# Altium footprint library PCBLIB.PcbLib: 557 footprints (part 28 of 36)
Each footprint in its own frame and in the unit in brackets; x right, y up, seen from the top. Pads: shape width x height; smd on the part's side, far side on the other; paste and mask are expansions set on the pad; w line width, h text height; cw(c..) or ccw(c..) is an arc to the next point about the centre after c.
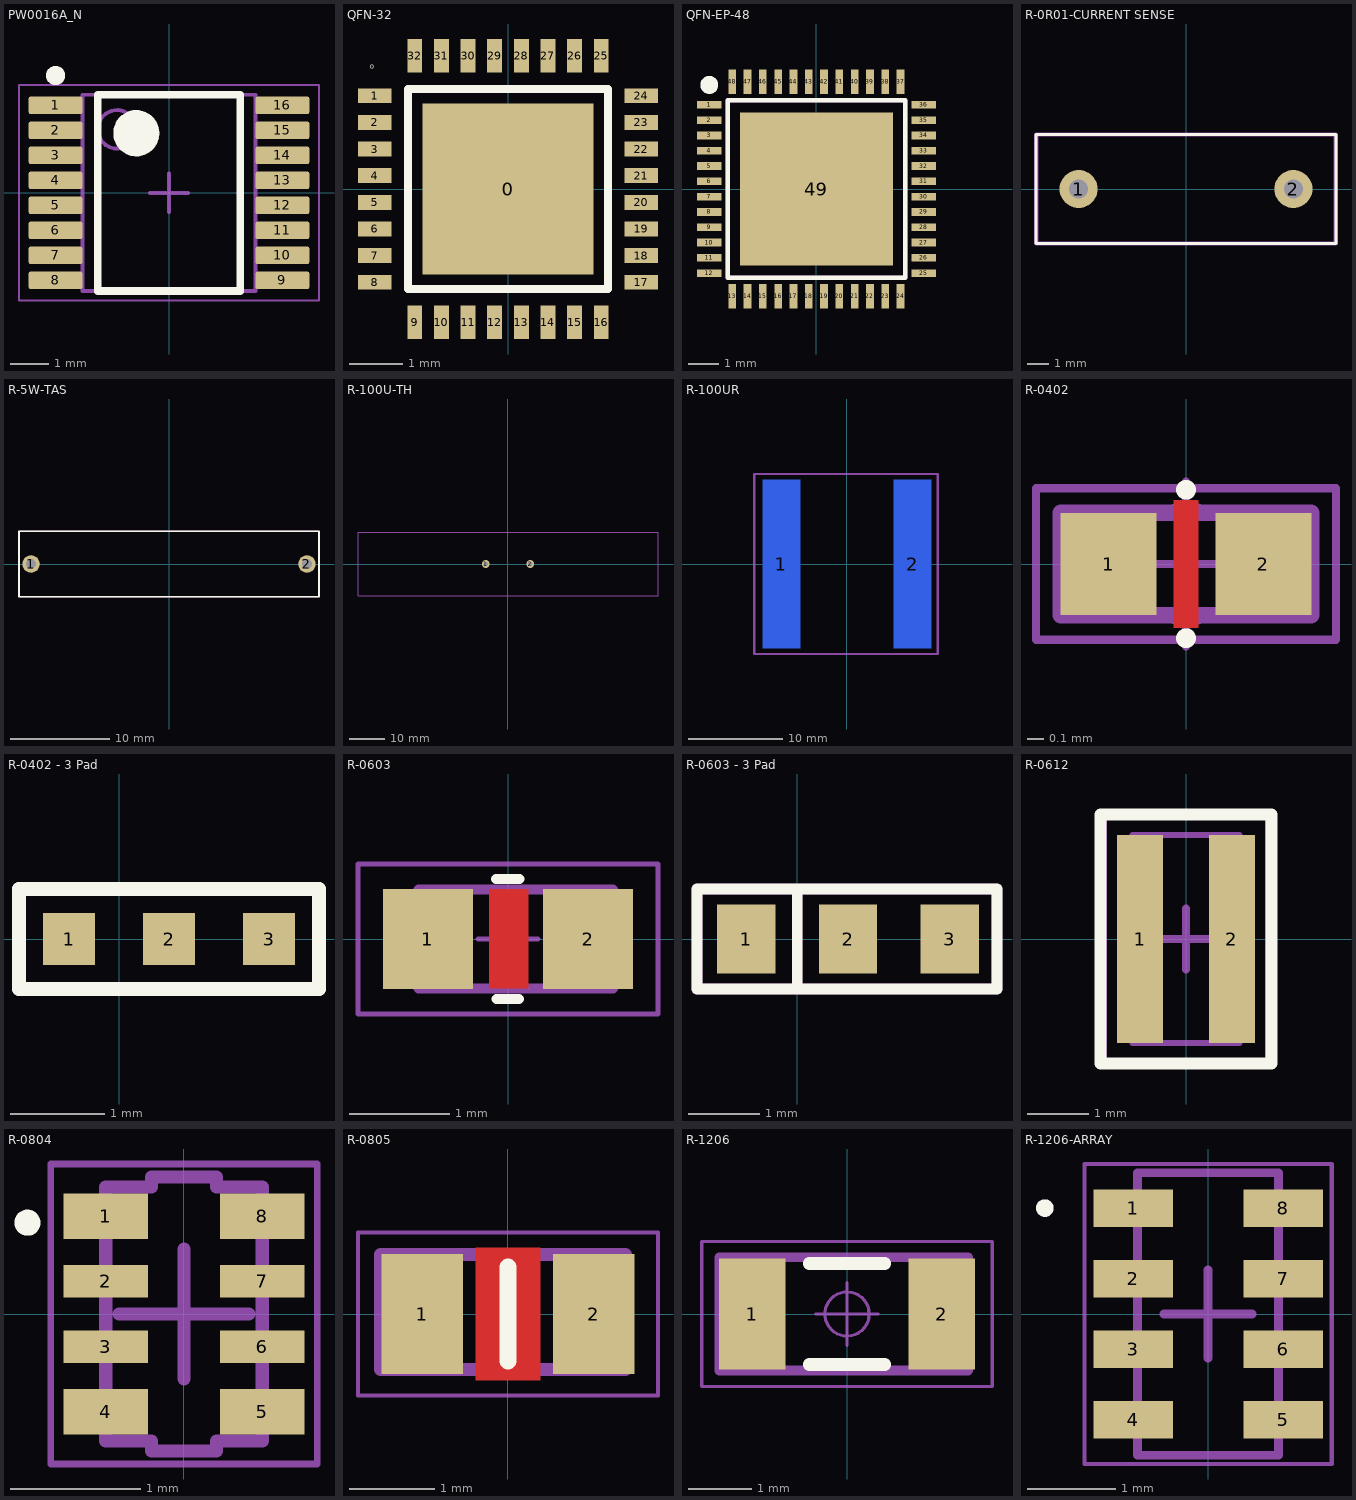
[diagram p27: the footprints below, top view; thin cyan lines are the x and y axes]

## PW0016A_N [mm] "SOP, 16-Leads, Body 5.1x4.5mm, Pitch 0.65mm, IPC Medium Density"
height 1.2
pads (16):
  rrect22% 1.4x0.45 smd: 1(-2.95,2.275) 2(-2.95,1.625) 3(-2.95,0.975) 4(-2.95,0.325) 5(-2.95,-0.325) 6(-2.95,-0.975) 7(-2.95,-1.625) 8(-2.95,-2.275) 9(2.95,-2.275) 10(2.95,-1.625) 11(2.95,-0.975) 12(2.95,-0.325) 13(2.95,0.325) 14(2.95,0.975) 15(2.95,1.625) 16(2.95,2.275)
Top Overlay:
  circle w0.25: c-2.95,3.05 r0.125
  circle w0.6: c-0.85,1.55 r0.3
  lines w0.2: -1.85,-2.55 -1.85,2.55 1.85,2.55 1.85,-2.55 -1.85,-2.55
Top 3D Body:
  text ".Designator" at -1.524,-0.508 h1.02
Mechanical 13:
  circle w0.1: c-1.35,1.65 r0.5
  lines w0.1: -2.25,-2.55 -2.25,2.55 2.25,2.55 2.25,-2.55 -2.25,-2.55
Mechanical 15:
  lines w0.05: -3.9,-2.8 -3.9,2.8 3.9,2.8 3.9,-2.8 -3.9,-2.8
  lines w0.1: -0.5,0 0.5,0 ; 0,-0.5 0,0.5
3D body "PW0016AakaMTC16.stp": height 1, standoff 0, extent -3.21,-2.5 3.21,2.5

## QFN-32 [mm]
pads (33):
  rect 3.2x3.2 smd paste-100 mask+0: 0(0,0)
  rect 0.63x0.28 smd mask+0.051: 1(-2.5,1.75) 2(-2.5,1.25) 3(-2.5,0.75) 4(-2.5,0.25) 5(-2.5,-0.25) 6(-2.5,-0.75) 7(-2.5,-1.25) 8(-2.5,-1.75) 17(2.5,-1.75) 18(2.5,-1.25) 19(2.5,-0.75) 20(2.5,-0.25) 21(2.5,0.25) 22(2.5,0.75) 23(2.5,1.25) 24(2.5,1.75)
  rect 0.28x0.63 smd mask+0.051: 9(-1.75,-2.5) 10(-1.25,-2.5) 11(-0.75,-2.5) 12(-0.25,-2.5) 13(0.25,-2.5) 14(0.75,-2.5) 15(1.25,-2.5) 16(1.75,-2.5) 25(1.75,2.5) 26(1.25,2.5) 27(0.75,2.5) 28(0.25,2.5) 29(-0.25,2.5) 30(-0.75,2.5) 31(-1.25,2.5) 32(-1.75,2.5)
Top Overlay:
  lines w0.152: -1.88,-1.88 -1.88,1.88 1.88,1.88 1.88,-1.88 -1.88,-1.88
  text "o" at -2.591,2.261 h0.1
3D body "QFN32-1.STEP": height 0.94, standoff 0.01, extent -2.515,-2.489 2.486,2.511

## QFN-EP-48 [mm]
pads (49):
  rect 0.8x0.25 smd mask+0.051: 1(-3.5,2.75) 2(-3.5,2.25) 3(-3.5,1.75) 4(-3.5,1.25) 5(-3.5,0.75) 6(-3.5,0.25) 7(-3.5,-0.25) 8(-3.5,-0.75) 9(-3.5,-1.25) 10(-3.5,-1.75) 11(-3.5,-2.25) 12(-3.5,-2.75) 25(3.5,-2.75) 26(3.5,-2.25) 27(3.5,-1.75) 28(3.5,-1.25) 29(3.5,-0.75) 30(3.5,-0.25) 31(3.5,0.25) 32(3.5,0.75) 33(3.5,1.25) 34(3.5,1.75) 35(3.5,2.25) 36(3.5,2.75)
  rect 0.25x0.8 smd mask+0.051: 13(-2.75,-3.5) 14(-2.25,-3.5) 15(-1.75,-3.5) 16(-1.25,-3.5) 17(-0.75,-3.5) 18(-0.25,-3.5) 19(0.25,-3.5) 20(0.75,-3.5) 21(1.25,-3.5) 22(1.75,-3.5) 23(2.25,-3.5) 24(2.75,-3.5) 37(2.75,3.5) 38(2.25,3.5) 39(1.75,3.5) 40(1.25,3.5) 41(0.75,3.5) 42(0.25,3.5) 43(-0.25,3.5) 44(-0.75,3.5) 45(-1.25,3.5) 46(-1.75,3.5) 47(-2.25,3.5) 48(-2.75,3.5)
  rect 5x5 smd paste-5.08: 49(0,0)
Top Overlay:
  circle w0.305: c-3.5,3.4 r0.141
  lines w0.152: -2.9,-2.9 2.9,-2.9 2.9,2.9 -2.9,2.9 -2.9,-2.9
Top Paste:
  region: 5.9,-0.2
  region: -0.568,2.349 0.579,2.349 0.579,1.213 -0.568,1.213
  region: -2.337,2.349 -1.2,2.349 -1.2,1.2 -2.337,1.2
  region: 1.2,2.349 2.324,2.349 2.324,1.213 1.2,1.213
  region: 1.2,0.541 2.324,0.541 2.324,-0.568 1.2,-0.568
  region: -0.575,0.567 0.548,0.567 0.548,-0.568 -0.575,-0.568
  region: -2.35,0.535 -1.2,0.535 -1.2,-0.575 -2.349,-0.575
  region: -2.35,-1.2 -1.2,-1.2 -1.2,-2.35 -2.349,-2.349
  region: -0.561,-1.213 0.561,-1.213 0.561,-2.35 -0.561,-2.349
  region: 1.2,-1.225 2.324,-1.225 2.324,-2.349 1.2,-2.35
ASM Top:
  lines w0.152: -2.9,-2.9 2.9,-2.9 2.9,2.9 -2.9,2.9 -2.9,-2.9
  text ".designator" at -1.905,-0.762 h0.8
3D body "QFN_48.STEP": height 1.11, standoff 0.01, extent -3.495,-3.505 3.505,3.495

## R-0R01-CURRENT SENSE [mil]
pads (2):
  round 70 hole 35: 1(-196.85,0) 2(196.85,0)
Top Overlay:
  lines w6: -275,-100 -275,100 275,100 275,-100 -275,-100
ASM Top:
  lines w7.87: -274.37,-99.47 -273.84,-100 274.47,-100 274.47,100 -274.37,100 -274.37,-99.47
  text ".designator" at -32,-7 h31.5
3D body "RADIAL-CURRENTSENSE.STEP": height 989.29, standoff -132.76, extent -275.59,-100 275.59,96.85

## R-5W-TAS [mil]
pads (2):
  round 70 hole 40: 1(-550,0) 2(550,0)
Top Overlay:
  lines w6: -598,-131 -598,131 598,131 598,-131 -598,-131
ASM Top:
  lines w6: -598,-131 598,-131 598,131 -598,131 -598,-131
  text ".designator" at -287,-22 h31.5
3D body "RES-5W.STEP": height 354.72, standoff -118.11, extent -567,-119.11 564.49,117.11

## R-100U-TH [mm]
pads (2):
  round 2.2 hole 1.4: 1(-6.26,0) 2(6.34,0)
ASM Top:
  lines w0.2: 42.534,8.993 -42.454,8.993 -42.454,-8.99 -42.454,-8.99 42.534,-8.99 42.534,8.993 ; 42.534,8.993 42.534,8.993
  text ".designator" at 0,0 h0.8
3D body "WSBS8518-20-60_100u.STEP": height 4.81, standoff -6.19, extent -42.454,-8.99 42.534,8.993

## R-100UR [mm]
pads (2):
  rect 4x18 smd far side: 1(-7,0) 2(7,0)
Bottom Overlay:
  lines w0.254: -9.903,-9.6 -9.903,9.6 9.697,9.6 9.697,-9.6 -9.903,-9.6
ASM Top:
  lines w0.254: -9.9,-9.6 -9.9,9.6 9.7,9.6 9.7,-9.6 -9.9,-9.6
  text ".designator" at -1.092,-0.203 h0.8
3D body "100uR sont.STEP": height -1.6, standoff -4.6, extent -42.545,-9.068 42.443,8.915

## R-0402 [mm]
pads (2):
  rect 0.58x0.62 smd: 1(-0.47,0) 2(0.47,0)
Top Layer:
  pour cut-out: -0.075,0.388 -0.075,-0.387 0.075,-0.387 0.075,0.388
Top Overlay:
  circle w0.1: c0,-0.45 r0.01
  circle w0.1: c0,0.45 r0.01
Mechanical 15:
  circle w0.05: c0,0 r0.35
  lines w0.05: -0.5,0 0.5,0 ; 0,-0.5 0,0.5 ; -0.91,-0.46 0.91,-0.46 0.91,0.46 -0.91,0.46 -0.91,-0.46
ASM Top:
  lines w0.1: -0.76,-0.31 0.76,-0.31 0.76,0.31 -0.76,0.31 -0.76,-0.31
  text ".designator" at -0.011,-0.078 h0.8
3D body "R_0402-son.STEP": height 0.36, standoff 0.01, extent -0.5,-0.25 0.5,0.25

## R-0402 - 3 Pad [mil]
pads (3):
  rect 22x22 smd: 1(-21,0) 2(21,0) 3(63,0)
Top Overlay:
  lines w6: -42,-21 84,-21 84,21 -42,21 -42,-21
ASM Top:
  lines w6: -42,-21 -42,21 84,21 84,-21 -42,-21
  text ".designator" at -28,-7 h31.5
3D body "R_0402-son.STEP": height 14.28, standoff 0.5, extent -22.37,-10 17,9.69

## R-0603 [mm]
pads (2):
  rect 0.9x1 smd: 1(-0.8,0) 2(0.8,0)
Top Layer:
  pour cut-out: -0.189,0.495 -0.189,-0.495 0.201,-0.495 0.201,0.495
Top Overlay:
  lines w0.1: -0.118,0.6 0.113,0.6 ; -0.116,-0.6 0.112,-0.6
Mechanical 15:
  lines w0.05: -0.3,0 0.3,0 ; 0,-0.3 0,0.3 ; -1.5,-0.75 -1.5,0.75 1.5,0.75 1.5,-0.75 -1.5,-0.75
ASM Top:
  lines w0.1: -0.893,-0.495 1.05,-0.495 1.05,0.495 -0.893,0.495 -0.893,-0.495
  text ".designator" at -0.394,-0.2 h0.8
3D body: height 0.25, standoff 0, extent 0.025,0.229 0.025,0.229
3D body "User Library-RES_1609-0603.STEP": height 0.57, standoff 0.01, extent -0.85,-0.4 0.85,0.4

## R-0603 - 3 Pad [mil]
pads (3):
  rect 32x38 smd mask+1.97: 1(-28,0) 2(28,0) 3(84,0)
Top Overlay:
  lines w5.91: 0,-27.56 0.1,27.56
  lines w6: -55.12,-27.56 -55.12,27.56 110,27.56 110,-27.56 -55.12,-27.56
ASM Top:
  lines w5.91: 0,-27.56 0.1,27.56
  lines w6: -55.12,-27.56 110,-27.56 110,27.56 -55.12,27.56 -55.12,-27.56
  text ".designator" at -40,-15 h31.5
3D body: height 10, standoff 0, extent 1,9 1,9
3D body "User Library-RES_1609-0603.STEP": height 22.55, standoff 0.5, extent -33.47,-16 33.47,15.49

## R-0612 [mm] "Chip Resistor, 2-Leads, Body 1,60x3,20mm, IPC Medium Density"
height 0.6
pads (2):
  rect 0.75x3.4 smd: 1(-0.75,0) 2(0.75,0)
Top Overlay:
  lines w0.2: -1.397,-2.032 1.397,-2.032 1.397,2.032 -1.397,2.032 -1.397,-2.032
Mechanical 15:
  lines w0.127: -0.5,0 0.5,0 ; 0,-0.5 0,0.5 ; -1.35,-2.032 1.35,-2.032 1.35,2.032 -1.35,2.032 -1.35,-2.032
ASM Top:
  lines w0.1: -0.875,-1.7 -0.875,1.7 0.875,1.7 0.875,-1.7 -0.875,-1.7
  text ".designator" at 0,-0.186 h0.8
3D body "0612.step": height 0.6, standoff 0, extent -0.875,-1.7 0.875,1.7

## R-0804 [mm] "SMD, 8-Leads, Body 2x1mm, Pitch 0.5mm"
height 0.45
pads (8):
  rect 0.65x0.35 smd mask+0.05: 1(-0.6,0.75) 4(-0.6,-0.75) 5(0.6,-0.75) 8(0.6,0.75)
  rect 0.65x0.25 smd mask+0.05: 2(-0.6,0.25) 3(-0.6,-0.25) 6(0.6,-0.25) 7(0.6,0.25)
Top Overlay:
  circle w0.1: c-1.2,0.7 r0.05
Mechanical 15:
  lines w0.05: -1.02,-1.15 -1.02,1.15 1.02,1.15 1.02,-1.15 -1.02,-1.15
  lines w0.1: -0.5,0 0.5,0 ; 0,-0.5 0,0.5
ASM Top:
  lines w0.1: -0.6,-0.975 -0.6,0.975 -0.25,0.975 -0.25,1.05 0.25,1.05 0.25,0.975 0.6,0.975 0.6,-0.975 0.25,-0.975 0.25,-1.05 -0.25,-1.05 -0.25,-0.975 -0.6,-0.975
  text ".designator" at -0.595,-0.194 h1.2
3D body "CAC-50P200X100-8L.step": height 0.45, standoff 0, extent -0.6,-1.05 0.6,1.05

## R-0805 [mm]
pads (2):
  rect 0.95x1.4 smd: 1(-1,0) 2(1,0)
Top Layer:
  pour cut-out: -0.375,0.775 -0.375,-0.775 0.375,-0.775 0.375,0.775
Top Overlay:
  lines w0.2: 0,-0.55 0,0.55
Mechanical 15:
  lines w0.05: -0.3,0 0.3,0 ; 0,-0.3 0,0.3 ; -1.75,-0.95 -1.75,0.95 1.75,0.95 1.75,-0.95 -1.75,-0.95
ASM Top:
  lines w0.152: -1.488,-0.647 1.371,-0.647 1.371,0.696 -1.488,0.696 -1.488,-0.647
  text ".designator" at -0.776,-0.303 h0.8
3D body "User Library-RES_2013-0805.STEP": height 0.77, standoff 0.01, extent -1.15,-0.675 1.15,0.675

## R-1206 [mm]
pads (2):
  rect 1.05x1.75 smd: 1(-1.5,0.001) 2(1.5,0.001)
Top Overlay:
  lines w0.2: -0.6,-0.799 0.6,-0.799 ; -0.6,0.801 0.6,0.801
Mechanical 15:
  circle w0.05: c0,0.001 r0.35
  lines w0.05: -0.5,0.001 0.5,0.001 ; 0,-0.499 0,0.501 ; -2.3,-1.149 -2.3,1.151 2.3,1.151 2.3,-1.149 -2.3,-1.149
ASM Top:
  lines w0.152: -2.025,-0.894 1.917,-0.894 1.917,0.901 -2.025,0.901 -2.025,-0.894
  text ".designator" at -0.733,-0.291 h0.8
3D body "User Library-RES_3216-1206.STEP": height 0.86, standoff 0.01, extent -1.675,-0.864 1.675,0.866

## R-1206-ARRAY [mm] "SMD, 8-Leads, Body 1.6x3.2mm, Pitch 0.8mm"
height 0.6
pads (8):
  rect 0.9x0.425 smd: 1(-0.85,1.2) 2(-0.85,0.4) 3(-0.85,-0.4) 4(-0.85,-1.2) 5(0.85,-1.2) 6(0.85,-0.4) 7(0.85,0.4) 8(0.85,1.2)
Top Overlay:
  circle w0.1: c-1.85,1.2 r0.05
Mechanical 15:
  lines w0.05: -1.4,-1.7 -1.4,1.7 1.4,1.7 1.4,-1.7 -1.4,-1.7
  lines w0.1: -0.5,0 0.5,0 ; 0,-0.5 0,0.5
ASM Top:
  lines w0.1: -0.8,-1.6 -0.8,1.6 0.8,1.6 0.8,-1.6 -0.8,-1.6
  text ".designator" at -0.399,-0.194 h1.2
3D body "BOUR-CAY16-J4-8.stp": height 0.6, standoff 0, extent -0.8,-1.6 0.8,1.6